# Altium schematic symbol library jlcpcb_2025_04_resistors_extended_2512.schlib: 2667 symbols (part 13 of 14) (continued)
## SMF25M2FR004T
designator R?  Resistance: 4mΩ  (hidden comment: *)
Resistor, 4mΩ, ±5%, 2W, ±100ppm/℃, -55℃~+170℃, SMD 2512; Manufacturer: Uniroyal; Manufacturer Part Number: SMF25M2FR004T; Supplier 1: LCSC; Supplier Part Number 1: C2692058; JLCPCB Part Number: C2692058; Power Rating: 2W; Category: Resistors; Package Size: 2512; JLCPCB Basic Part: Yes; Tolerance: ±5%; Temperature Coefficient: ±100ppm/℃; Temperature Rating: -55℃~+170℃; ComponentLink1Description: Datasheet; ComponentLink1URL: https://wmsc.lcsc.com/wmsc/upload/file/pdf/v2/lcsc/2201121130_SART-Nanjing-Sart-Tech-SMF25M2FR004T_C2692058.pdf; ComponentLink2Description: JLCPCB Part URL; ComponentLink2URL: https://jlcpcb.com/partdetail/C2692058
pins: 1, 2
1 alternate drawing of the same symbol

## SR2512FK-7W10RL
designator R?  Resistance: 10Ω  (hidden comment: *)
Resistor, 10Ω, ±1%, 2W, ±200ppm/℃, -55℃~+155℃, SMD 2512; Manufacturer: Uniroyal; Manufacturer Part Number: SR2512FK-7W10RL; Supplier 1: LCSC; Supplier Part Number 1: C876843; JLCPCB Part Number: C876843; Power Rating: 2W; Category: Resistors; Package Size: 2512; JLCPCB Basic Part: Yes; Tolerance: ±1%; Temperature Coefficient: ±200ppm/℃; Temperature Rating: -55℃~+155℃; ComponentLink1Description: Datasheet; ComponentLink1URL: https://wmsc.lcsc.com/wmsc/upload/file/pdf/v2/lcsc/2311211102_YAGEO-SR2512FK-7W10RL_C876843.pdf; ComponentLink2Description: JLCPCB Part URL; ComponentLink2URL: https://jlcpcb.com/partdetail/C876843
pins: 1, 2
1 alternate drawing of the same symbol

## SR2512FK-7W22RL
designator R?  Resistance: 22Ω  (hidden comment: *)
Resistor, 22Ω, ±1%, 2W, ±200ppm/℃, -55℃~+155℃, SMD 2512; Manufacturer: Uniroyal; Manufacturer Part Number: SR2512FK-7W22RL; Supplier 1: LCSC; Supplier Part Number 1: C876849; JLCPCB Part Number: C876849; Power Rating: 2W; Category: Resistors; Package Size: 2512; JLCPCB Basic Part: Yes; Tolerance: ±1%; Temperature Coefficient: ±200ppm/℃; Temperature Rating: -55℃~+155℃; ComponentLink1Description: Datasheet; ComponentLink1URL: https://wmsc.lcsc.com/wmsc/upload/file/pdf/v2/lcsc/2404241604_YAGEO-SR2512FK-7W22RL_C876849.pdf; ComponentLink2Description: JLCPCB Part URL; ComponentLink2URL: https://jlcpcb.com/partdetail/C876849
pins: 1, 2
1 alternate drawing of the same symbol

## SR2512FK-072R2L
designator R?  Resistance: 2.2Ω  (hidden comment: *)
Resistor, 2.2Ω, ±1%, 1W, 200V, ±200ppm/℃, -55℃~+155℃, SMD 2512; Manufacturer: Uniroyal; Manufacturer Part Number: SR2512FK-072R2L; Supplier 1: LCSC; Supplier Part Number 1: C2936638; JLCPCB Part Number: C2936638; Power Rating: 1W; Category: Resistors; Package Size: 2512; JLCPCB Basic Part: Yes; Tolerance: ±1%; Voltage Rating: 200V; Temperature Coefficient: ±200ppm/℃; Temperature Rating: -55℃~+155℃; ComponentLink1Description: Datasheet; ComponentLink1URL: https://wmsc.lcsc.com/wmsc/upload/file/pdf/v2/lcsc/2201121730_YAGEO-SR2512FK-072R2L_C2936638.pdf; ComponentLink2Description: JLCPCB Part URL; ComponentLink2URL: https://jlcpcb.com/partdetail/C2936638
pins: 1, 2
1 alternate drawing of the same symbol

## SR2512FK-0747RL
designator R?  Resistance: 47Ω  (hidden comment: *)
Resistor, 47Ω, ±1%, 1W, ±100ppm/℃, -55℃~+155℃, SMD 2512; Manufacturer: Uniroyal; Manufacturer Part Number: SR2512FK-0747RL; Supplier 1: LCSC; Supplier Part Number 1: C3014194; JLCPCB Part Number: C3014194; Power Rating: 1W; Category: Resistors; Package Size: 2512; JLCPCB Basic Part: Yes; Tolerance: ±1%; Temperature Coefficient: ±100ppm/℃; Temperature Rating: -55℃~+155℃; ComponentLink1Description: Datasheet; ComponentLink1URL: https://wmsc.lcsc.com/wmsc/upload/file/pdf/v2/lcsc/2205121145_YAGEO-SR2512FK-0747RL_C3014194.pdf; ComponentLink2Description: JLCPCB Part URL; ComponentLink2URL: https://jlcpcb.com/partdetail/C3014194
pins: 1, 2
1 alternate drawing of the same symbol

## SR2512FK-0751RL
designator R?  Resistance: 51Ω  (hidden comment: *)
Resistor, 51Ω, ±1%, 1W, 200V, ±100ppm/℃, -55℃~+155℃, SMD 2512; Manufacturer: Uniroyal; Manufacturer Part Number: SR2512FK-0751RL; Supplier 1: LCSC; Supplier Part Number 1: C375694; JLCPCB Part Number: C375694; Power Rating: 1W; Category: Resistors; Package Size: 2512; JLCPCB Basic Part: Yes; Tolerance: ±1%; Voltage Rating: 200V; Temperature Coefficient: ±100ppm/℃; Temperature Rating: -55℃~+155℃; ComponentLink1Description: Datasheet; ComponentLink1URL: https://wmsc.lcsc.com/wmsc/upload/file/pdf/v2/lcsc/1912111437_YAGEO-SR2512FK-0751RL_C375694.pdf; ComponentLink2Description: JLCPCB Part URL; ComponentLink2URL: https://jlcpcb.com/partdetail/C375694
pins: 1, 2
1 alternate drawing of the same symbol

## SR2512JK-071K2L
designator R?  Resistance: 1.2kΩ  (hidden comment: *)
Resistor, 1.2kΩ, ±5%, 1W, 200V, ±100ppm/℃, -55℃~+155℃, SMD 2512; Manufacturer: Uniroyal; Manufacturer Part Number: SR2512JK-071K2L; Supplier 1: LCSC; Supplier Part Number 1: C723719; JLCPCB Part Number: C723719; Power Rating: 1W; Category: Resistors; Package Size: 2512; JLCPCB Basic Part: Yes; Tolerance: ±5%; Voltage Rating: 200V; Temperature Coefficient: ±100ppm/℃; Temperature Rating: -55℃~+155℃; ComponentLink1Description: Datasheet; ComponentLink1URL: https://wmsc.lcsc.com/wmsc/upload/file/pdf/v2/lcsc/2304140030_YAGEO-SR2512JK-071K2L_C723719.pdf; ComponentLink2Description: JLCPCB Part URL; ComponentLink2URL: https://jlcpcb.com/partdetail/C723719
pins: 1, 2
1 alternate drawing of the same symbol

## SR2512JK-071R5L
designator R?  Resistance: 1.5Ω  (hidden comment: *)
Resistor, 1.5Ω, ±5%, 1W, 200V, ±200ppm/℃, -55℃~+155℃, SMD 2512; Manufacturer: Uniroyal; Manufacturer Part Number: SR2512JK-071R5L; Supplier 1: LCSC; Supplier Part Number 1: C876869; JLCPCB Part Number: C876869; Power Rating: 1W; Category: Resistors; Package Size: 2512; JLCPCB Basic Part: Yes; Tolerance: ±5%; Voltage Rating: 200V; Temperature Coefficient: ±200ppm/℃; Temperature Rating: -55℃~+155℃; ComponentLink1Description: Datasheet; ComponentLink1URL: https://wmsc.lcsc.com/wmsc/upload/file/pdf/v2/lcsc/2112131830_YAGEO-SR2512JK-071R5L_C876869.pdf; ComponentLink2Description: JLCPCB Part URL; ComponentLink2URL: https://jlcpcb.com/partdetail/C876869
pins: 1, 2
1 alternate drawing of the same symbol

## SR2512JK-072R7L
designator R?  Resistance: 2.7Ω  (hidden comment: *)
Resistor, 2.7Ω, ±5%, 1W, 200V, ±200ppm/℃, -55℃~+155℃, SMD 2512; Manufacturer: Uniroyal; Manufacturer Part Number: SR2512JK-072R7L; Supplier 1: LCSC; Supplier Part Number 1: C2936614; JLCPCB Part Number: C2936614; Power Rating: 1W; Category: Resistors; Package Size: 2512; JLCPCB Basic Part: Yes; Tolerance: ±5%; Voltage Rating: 200V; Temperature Coefficient: ±200ppm/℃; Temperature Rating: -55℃~+155℃; ComponentLink1Description: Datasheet; ComponentLink1URL: https://wmsc.lcsc.com/wmsc/upload/file/pdf/v2/lcsc/2201121730_YAGEO-SR2512JK-072R7L_C2936614.pdf; ComponentLink2Description: JLCPCB Part URL; ComponentLink2URL: https://jlcpcb.com/partdetail/C2936614
pins: 1, 2
1 alternate drawing of the same symbol

## SR2512JK-074R7L
designator R?  Resistance: 4.7Ω  (hidden comment: *)
Resistor, 4.7Ω, ±5%, 1W, 200V, ±200ppm/℃, -55℃~+155℃, SMD 2512; Manufacturer: Uniroyal; Manufacturer Part Number: SR2512JK-074R7L; Supplier 1: LCSC; Supplier Part Number 1: C876895; JLCPCB Part Number: C876895; Power Rating: 1W; Category: Resistors; Package Size: 2512; JLCPCB Basic Part: Yes; Tolerance: ±5%; Voltage Rating: 200V; Temperature Coefficient: ±200ppm/℃; Temperature Rating: -55℃~+155℃; ComponentLink1Description: Datasheet; ComponentLink1URL: https://wmsc.lcsc.com/wmsc/upload/file/pdf/v2/lcsc/2112131830_YAGEO-SR2512JK-074R7L_C876895.pdf; ComponentLink2Description: JLCPCB Part URL; ComponentLink2URL: https://jlcpcb.com/partdetail/C876895
pins: 1, 2
1 alternate drawing of the same symbol

## SR2512JK-075R1L
designator R?  Resistance: 5.1Ω  (hidden comment: *)
Resistor, 5.1Ω, ±5%, 1W, 200V, ±200ppm/℃, -55℃~+155℃, SMD 2512; Manufacturer: Uniroyal; Manufacturer Part Number: SR2512JK-075R1L; Supplier 1: LCSC; Supplier Part Number 1: C876898; JLCPCB Part Number: C876898; Power Rating: 1W; Category: Resistors; Package Size: 2512; JLCPCB Basic Part: Yes; Tolerance: ±5%; Voltage Rating: 200V; Temperature Coefficient: ±200ppm/℃; Temperature Rating: -55℃~+155℃; ComponentLink1Description: Datasheet; ComponentLink1URL: https://wmsc.lcsc.com/wmsc/upload/file/pdf/v2/lcsc/2112131830_YAGEO-SR2512JK-075R1L_C876898.pdf; ComponentLink2Description: JLCPCB Part URL; ComponentLink2URL: https://jlcpcb.com/partdetail/C876898
pins: 1, 2
1 alternate drawing of the same symbol

## SR2512JK-076R8L
designator R?  Resistance: 6.8Ω  (hidden comment: *)
Resistor, 6.8Ω, ±5%, 1W, 200V, ±200ppm/℃, -55℃~+155℃, SMD 2512; Manufacturer: Uniroyal; Manufacturer Part Number: SR2512JK-076R8L; Supplier 1: LCSC; Supplier Part Number 1: C2936600; JLCPCB Part Number: C2936600; Power Rating: 1W; Category: Resistors; Package Size: 2512; JLCPCB Basic Part: Yes; Tolerance: ±5%; Voltage Rating: 200V; Temperature Coefficient: ±200ppm/℃; Temperature Rating: -55℃~+155℃; ComponentLink1Description: Datasheet; ComponentLink1URL: https://wmsc.lcsc.com/wmsc/upload/file/pdf/v2/lcsc/2201121730_YAGEO-SR2512JK-076R8L_C2936600.pdf; ComponentLink2Description: JLCPCB Part URL; ComponentLink2URL: https://jlcpcb.com/partdetail/C2936600
pins: 1, 2
1 alternate drawing of the same symbol

## SR2512JK-0720RL
designator R?  Resistance: 20Ω  (hidden comment: *)
Resistor, 20Ω, ±5%, 1W, 200V, ±100ppm/℃, -55℃~+155℃, SMD 2512; Manufacturer: Uniroyal; Manufacturer Part Number: SR2512JK-0720RL; Supplier 1: LCSC; Supplier Part Number 1: C723493; JLCPCB Part Number: C723493; Power Rating: 1W; Category: Resistors; Package Size: 2512; JLCPCB Basic Part: Yes; Tolerance: ±5%; Voltage Rating: 200V; Temperature Coefficient: ±100ppm/℃; Temperature Rating: -55℃~+155℃; ComponentLink1Description: Datasheet; ComponentLink1URL: https://wmsc.lcsc.com/wmsc/upload/file/pdf/v2/lcsc/2304140030_YAGEO-SR2512JK-0720RL_C723493.pdf; ComponentLink2Description: JLCPCB Part URL; ComponentLink2URL: https://jlcpcb.com/partdetail/C723493
pins: 1, 2
1 alternate drawing of the same symbol

## SR2512KK-076R8L
designator R?  Resistance: 6.8Ω  (hidden comment: *)
Resistor, 6.8Ω, ±10%, 1W, ±200ppm/℃, -55℃~+155℃, SMD 2512; Manufacturer: Uniroyal; Manufacturer Part Number: SR2512KK-076R8L; Supplier 1: LCSC; Supplier Part Number 1: C3014190; JLCPCB Part Number: C3014190; Power Rating: 1W; Category: Resistors; Package Size: 2512; JLCPCB Basic Part: Yes; Tolerance: ±10%; Temperature Coefficient: ±200ppm/℃; Temperature Rating: -55℃~+155℃; ComponentLink1Description: Datasheet; ComponentLink1URL: https://wmsc.lcsc.com/wmsc/upload/file/pdf/v2/lcsc/2205121145_YAGEO-SR2512KK-076R8L_C3014190.pdf; ComponentLink2Description: JLCPCB Part URL; ComponentLink2URL: https://jlcpcb.com/partdetail/C3014190
pins: 1, 2
1 alternate drawing of the same symbol

## SWR12JTEA0470
designator R?  Resistance: 47Ω  (hidden comment: *)
Resistor, 47Ω, ±5%, 1.5W, 500V, ±100ppm/℃, -55℃~+155℃, SMD 2512; Manufacturer: Uniroyal; Manufacturer Part Number: SWR12JTEA0470; Supplier 1: LCSC; Supplier Part Number 1: C2913007; JLCPCB Part Number: C2913007; Power Rating: 1.5W; Category: Resistors; Package Size: 2512; JLCPCB Basic Part: Yes; Tolerance: ±5%; Voltage Rating: 500V; Temperature Coefficient: ±100ppm/℃; Temperature Rating: -55℃~+155℃; ComponentLink1Description: Datasheet; ComponentLink1URL: https://wmsc.lcsc.com/wmsc/upload/file/pdf/v2/lcsc/2110281830_Viking-Tech-SWR12JTEA0470_C2913007.pdf; ComponentLink2Description: JLCPCB Part URL; ComponentLink2URL: https://jlcpcb.com/partdetail/C2913007
pins: 1, 2
1 alternate drawing of the same symbol

## TC1250B2801T4P
designator R?  Resistance: 2.8kΩ  (hidden comment: *)
Resistor, 2.8kΩ, ±0.1%, 500mW, ±50ppm/℃, SMD 2512; Manufacturer: Uniroyal; Manufacturer Part Number: TC1250B2801T4P; Supplier 1: LCSC; Supplier Part Number 1: C517745; JLCPCB Part Number: C517745; Power Rating: 500mW; Category: Resistors; Package Size: 2512; JLCPCB Basic Part: Yes; Tolerance: ±0.1%; Temperature Coefficient: ±50ppm/℃; ComponentLink1Description: Datasheet; ComponentLink1URL: https://wmsc.lcsc.com/wmsc/upload/file/pdf/v2/lcsc/2304140030_UNI-ROYAL-Uniroyal-Elec-TC1250B2801T4P_C517745.pdf; ComponentLink2Description: JLCPCB Part URL; ComponentLink2URL: https://jlcpcb.com/partdetail/C517745
pins: 1, 2
1 alternate drawing of the same symbol

## TGL251220FR150E04Z
designator R?  Resistance: 150mΩ  (hidden comment: *)
Resistor, 150mΩ, ±1%, 2W, ±50ppm/℃, -55℃~+170℃, SMD 2512; Manufacturer: Uniroyal; Manufacturer Part Number: TGL251220FR150E04Z; Supplier 1: LCSC; Supplier Part Number 1: C881082; JLCPCB Part Number: C881082; Power Rating: 2W; Category: Resistors; Package Size: 2512; JLCPCB Basic Part: Yes; Tolerance: ±1%; Temperature Coefficient: ±50ppm/℃; Temperature Rating: -55℃~+170℃; ComponentLink1Description: Datasheet; ComponentLink1URL: https://wmsc.lcsc.com/wmsc/upload/file/pdf/v2/lcsc/2304140030_Ever-Ohms-Tech-TGL251220FR150E04Z_C881082.pdf; ComponentLink2Description: JLCPCB Part URL; ComponentLink2URL: https://jlcpcb.com/partdetail/C881082
pins: 1, 2
1 alternate drawing of the same symbol

## TGL251220FR500E04Z
designator R?  Resistance: 500mΩ  (hidden comment: *)
Resistor, 500mΩ, ±1%, 2W, ±50ppm/℃, -55℃~+170℃, SMD 2512; Manufacturer: Uniroyal; Manufacturer Part Number: TGL251220FR500E04Z; Supplier 1: LCSC; Supplier Part Number 1: C881206; JLCPCB Part Number: C881206; Power Rating: 2W; Category: Resistors; Package Size: 2512; JLCPCB Basic Part: Yes; Tolerance: ±1%; Temperature Coefficient: ±50ppm/℃; Temperature Rating: -55℃~+170℃; ComponentLink1Description: Datasheet; ComponentLink1URL: https://wmsc.lcsc.com/wmsc/upload/file/pdf/v2/lcsc/2304140030_Ever-Ohms-Tech-TGL251220FR500E04Z_C881206.pdf; ComponentLink2Description: JLCPCB Part URL; ComponentLink2URL: https://jlcpcb.com/partdetail/C881206
pins: 1, 2
1 alternate drawing of the same symbol

## TJ12G4992BT
designator R?  Resistance: 49.9kΩ  (hidden comment: *)
Resistor, 49.9kΩ, ±0.1%, 1W, ±25ppm/℃, -55℃~+155℃, SMD 2512; Manufacturer: Uniroyal; Manufacturer Part Number: TJ12G4992BT; Supplier 1: LCSC; Supplier Part Number 1: C2961443; JLCPCB Part Number: C2961443; Power Rating: 1W; Category: Resistors; Package Size: 2512; JLCPCB Basic Part: Yes; Tolerance: ±0.1%; Temperature Coefficient: ±25ppm/℃; Temperature Rating: -55℃~+155℃; ComponentLink1Description: Datasheet; ComponentLink1URL: https://wmsc.lcsc.com/wmsc/upload/file/pdf/v2/lcsc/2201241630_FH--Guangdong-Fenghua-Advanced-Tech-TJ12G4992BT_C2961443.pdf; ComponentLink2Description: JLCPCB Part URL; ComponentLink2URL: https://jlcpcb.com/partdetail/C2961443
pins: 1, 2
1 alternate drawing of the same symbol

## TLR3APDTE10L0F75
designator R?  Resistance: 10mΩ  (hidden comment: *)
Resistor, 10mΩ, ±1%, 3W, ±75ppm/℃, -65℃~+170℃, SMD 2512; Manufacturer: Uniroyal; Manufacturer Part Number: TLR3APDTE10L0F75; Supplier 1: LCSC; Supplier Part Number 1: C782250; JLCPCB Part Number: C782250; Power Rating: 3W; Category: Resistors; Package Size: 2512; JLCPCB Basic Part: Yes; Tolerance: ±1%; Temperature Coefficient: ±75ppm/℃; Temperature Rating: -65℃~+170℃; ComponentLink1Description: Datasheet; ComponentLink1URL: https://wmsc.lcsc.com/wmsc/upload/file/pdf/v2/lcsc/2009101103_KOA-Speer-Elec-TLR3APDTE10L0F75_C782250.pdf; ComponentLink2Description: JLCPCB Part URL; ComponentLink2URL: https://jlcpcb.com/partdetail/C782250
pins: 1, 2
1 alternate drawing of the same symbol

## TLR3APDTEL820F75
designator R?  Resistance: 0.82mΩ  (hidden comment: *)
Resistor, 0.82mΩ, ±1%, 5W, ±75ppm/℃, -65℃~+170℃, SMD 2512; Manufacturer: Uniroyal; Manufacturer Part Number: TLR3APDTEL820F75; Supplier 1: LCSC; Supplier Part Number 1: C4121274; JLCPCB Part Number: C4121274; Power Rating: 5W; Category: Resistors; Package Size: 2512; JLCPCB Basic Part: Yes; Tolerance: ±1%; Temperature Coefficient: ±75ppm/℃; Temperature Rating: -65℃~+170℃; ComponentLink1Description: Datasheet; ComponentLink1URL: https://wmsc.lcsc.com/wmsc/upload/file/pdf/v2/lcsc/2404101036_KOA-Speer-Elec-TLR3APDTEL820F75_C4121274.pdf; ComponentLink2Description: JLCPCB Part URL; ComponentLink2URL: https://jlcpcb.com/partdetail/C4121274
pins: 1, 2
1 alternate drawing of the same symbol

## TLR3AWDTE5L00F
designator R?  Resistance: 5mΩ  (hidden comment: *)
Resistor, 5mΩ, ±1%, 2W, ±150ppm/℃, -65℃~+170℃, SMD 2512; Manufacturer: Uniroyal; Manufacturer Part Number: TLR3AWDTE5L00F; Supplier 1: LCSC; Supplier Part Number 1: C782251; JLCPCB Part Number: C782251; Power Rating: 2W; Category: Resistors; Package Size: 2512; JLCPCB Basic Part: Yes; Tolerance: ±1%; Temperature Coefficient: ±150ppm/℃; Temperature Rating: -65℃~+170℃; ComponentLink1Description: Datasheet; ComponentLink1URL: https://wmsc.lcsc.com/wmsc/upload/file/pdf/v2/lcsc/2009101908_KOA-Speer-Elec-TLR3AWDTE5L00F_C782251.pdf; ComponentLink2Description: JLCPCB Part URL; ComponentLink2URL: https://jlcpcb.com/partdetail/C782251
pins: 1, 2
1 alternate drawing of the same symbol

## TLR3AWDTE6L00F
designator R?  Resistance: 6mΩ  (hidden comment: *)
Resistor, 6mΩ, ±1%, 2W, ±150ppm/℃, -65℃~+170℃, SMD 2512; Manufacturer: Uniroyal; Manufacturer Part Number: TLR3AWDTE6L00F; Supplier 1: LCSC; Supplier Part Number 1: C782252; JLCPCB Part Number: C782252; Power Rating: 2W; Category: Resistors; Package Size: 2512; JLCPCB Basic Part: Yes; Tolerance: ±1%; Temperature Coefficient: ±150ppm/℃; Temperature Rating: -65℃~+170℃; ComponentLink1Description: Datasheet; ComponentLink1URL: https://wmsc.lcsc.com/wmsc/upload/file/pdf/v2/lcsc/2009101908_KOA-Speer-Elec-TLR3AWDTE6L00F_C782252.pdf; ComponentLink2Description: JLCPCB Part URL; ComponentLink2URL: https://jlcpcb.com/partdetail/C782252
pins: 1, 2
1 alternate drawing of the same symbol

## TLRP3A30CR033FTE
designator R?  Resistance: 33mΩ  (hidden comment: *)
Resistor, 33mΩ, ±1%, 3W, ±25ppm/℃, -55℃~+170℃, SMD 2512; Manufacturer: Uniroyal; Manufacturer Part Number: TLRP3A30CR033FTE; Supplier 1: LCSC; Supplier Part Number 1: C4277659; JLCPCB Part Number: C4277659; Power Rating: 3W; Category: Resistors; Package Size: 2512; JLCPCB Basic Part: Yes; Tolerance: ±1%; Temperature Coefficient: ±25ppm/℃; Temperature Rating: -55℃~+170℃; ComponentLink1Description: Datasheet; ComponentLink1URL: https://wmsc.lcsc.com/wmsc/upload/file/pdf/v2/lcsc/2404111717_TE-Connectivity-TLRP3A30CR033FTE_C4277659.pdf; ComponentLink2Description: JLCPCB Part URL; ComponentLink2URL: https://jlcpcb.com/partdetail/C4277659
pins: 1, 2
1 alternate drawing of the same symbol

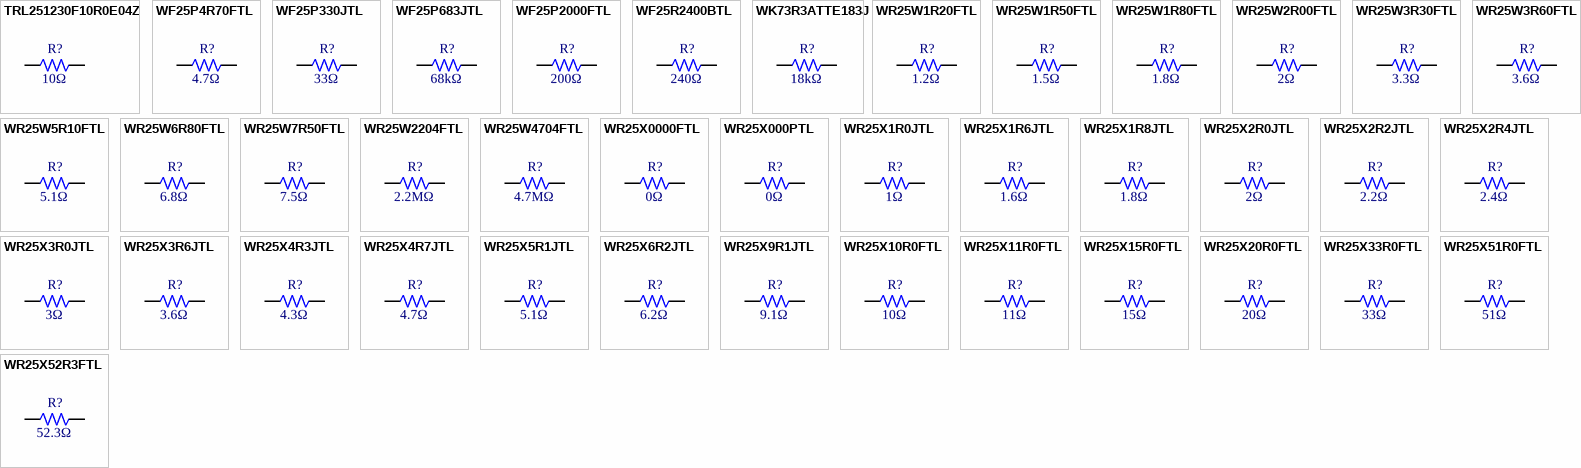
[diagram p62: symbols TRL251230F10R0E04Z to WR25X52R3FTL]

## TRL251230F10R0E04Z
designator R?  Resistance: 10Ω  (hidden comment: *)
Resistor, 10Ω, ±1%, 3W, ±50ppm/℃, -55℃~+155℃, SMD 2512; Manufacturer: Uniroyal; Manufacturer Part Number: TRL251230F10R0E04Z; Supplier 1: LCSC; Supplier Part Number 1: C2992634; JLCPCB Part Number: C2992634; Power Rating: 3W; Category: Resistors; Package Size: 2512; JLCPCB Basic Part: Yes; Tolerance: ±1%; Temperature Coefficient: ±50ppm/℃; Temperature Rating: -55℃~+155℃; ComponentLink1Description: Datasheet; ComponentLink1URL: https://wmsc.lcsc.com/wmsc/upload/file/pdf/v2/lcsc/2204082230_Ever-Ohms-Tech-TRL251230F10R0E04Z_C2992634.pdf; ComponentLink2Description: JLCPCB Part URL; ComponentLink2URL: https://jlcpcb.com/partdetail/C2992634
pins: 1, 2
1 alternate drawing of the same symbol

## WF25P4R70FTL
designator R?  Resistance: 4.7Ω  (hidden comment: *)
Resistor, 4.7Ω, ±1%, 2W, 300V, ±100ppm/℃, -55℃~+155℃, SMD 2512; Manufacturer: Uniroyal; Manufacturer Part Number: WF25P4R70FTL; Supplier 1: LCSC; Supplier Part Number 1: C305271; JLCPCB Part Number: C305271; Power Rating: 2W; Category: Resistors; Package Size: 2512; JLCPCB Basic Part: Yes; Tolerance: ±1%; Voltage Rating: 300V; Temperature Coefficient: ±100ppm/℃; Temperature Rating: -55℃~+155℃; ComponentLink1Description: Datasheet; ComponentLink1URL: https://wmsc.lcsc.com/wmsc/upload/file/pdf/v2/lcsc/2304140030_Walsin-Tech-Corp-WF25P4R70FTL_C305271.pdf; ComponentLink2Description: JLCPCB Part URL; ComponentLink2URL: https://jlcpcb.com/partdetail/C305271
pins: 1, 2
1 alternate drawing of the same symbol

## WF25P330JTL
designator R?  Resistance: 33Ω  (hidden comment: *)
Resistor, 33Ω, ±5%, 1W, 200V, ±100ppm/℃, -55℃~+155℃, SMD 2512; Manufacturer: Uniroyal; Manufacturer Part Number: WF25P330JTL; Supplier 1: LCSC; Supplier Part Number 1: C2974579; JLCPCB Part Number: C2974579; Power Rating: 1W; Category: Resistors; Package Size: 2512; JLCPCB Basic Part: Yes; Tolerance: ±5%; Voltage Rating: 200V; Temperature Coefficient: ±100ppm/℃; Temperature Rating: -55℃~+155℃; ComponentLink1Description: Datasheet; ComponentLink1URL: https://wmsc.lcsc.com/wmsc/upload/file/pdf/v2/lcsc/2202111500_Walsin-Tech-Corp-WF25P330JTL_C2974579.pdf; ComponentLink2Description: JLCPCB Part URL; ComponentLink2URL: https://jlcpcb.com/partdetail/C2974579
pins: 1, 2
1 alternate drawing of the same symbol

## WF25P683JTL
designator R?  Resistance: 68kΩ  (hidden comment: *)
Resistor, 68kΩ, ±5%, 2W, 200V, ±100ppm/℃, -55℃~+155℃, SMD 2512; Manufacturer: Uniroyal; Manufacturer Part Number: WF25P683JTL; Supplier 1: LCSC; Supplier Part Number 1: C2974581; JLCPCB Part Number: C2974581; Power Rating: 2W; Category: Resistors; Package Size: 2512; JLCPCB Basic Part: Yes; Tolerance: ±5%; Voltage Rating: 200V; Temperature Coefficient: ±100ppm/℃; Temperature Rating: -55℃~+155℃; ComponentLink1Description: Datasheet; ComponentLink1URL: https://wmsc.lcsc.com/wmsc/upload/file/pdf/v2/lcsc/2202111500_Walsin-Tech-Corp-WF25P683JTL_C2974581.pdf; ComponentLink2Description: JLCPCB Part URL; ComponentLink2URL: https://jlcpcb.com/partdetail/C2974581
pins: 1, 2
1 alternate drawing of the same symbol

## WF25P2000FTL
designator R?  Resistance: 200Ω  (hidden comment: *)
Resistor, 200Ω, ±1%, 2W, 300V, ±100ppm/℃, -55℃~+155℃, SMD 2512; Manufacturer: Uniroyal; Manufacturer Part Number: WF25P2000FTL; Supplier 1: LCSC; Supplier Part Number 1: C2991396; JLCPCB Part Number: C2991396; Power Rating: 2W; Category: Resistors; Package Size: 2512; JLCPCB Basic Part: Yes; Tolerance: ±1%; Voltage Rating: 300V; Temperature Coefficient: ±100ppm/℃; Temperature Rating: -55℃~+155℃; ComponentLink1Description: Datasheet; ComponentLink1URL: https://wmsc.lcsc.com/wmsc/upload/file/pdf/v2/lcsc/2204081930_Walsin-Tech-Corp-WF25P2000FTL_C2991396.pdf; ComponentLink2Description: JLCPCB Part URL; ComponentLink2URL: https://jlcpcb.com/partdetail/C2991396
pins: 1, 2
1 alternate drawing of the same symbol

## WF25R2400BTL
designator R?  Resistance: 240Ω  (hidden comment: *)
Resistor, 240Ω, ±0.1%, 1W, 200V, ±25ppm/℃, -55℃~+155℃, SMD 2512; Manufacturer: Uniroyal; Manufacturer Part Number: WF25R2400BTL; Supplier 1: LCSC; Supplier Part Number 1: C305272; JLCPCB Part Number: C305272; Power Rating: 1W; Category: Resistors; Package Size: 2512; JLCPCB Basic Part: Yes; Tolerance: ±0.1%; Voltage Rating: 200V; Temperature Coefficient: ±25ppm/℃; Temperature Rating: -55℃~+155℃; ComponentLink1Description: Datasheet; ComponentLink1URL: https://wmsc.lcsc.com/wmsc/upload/file/pdf/v2/lcsc/1811141211_Walsin-Tech-Corp-WF25R2400BTL_C305272.pdf; ComponentLink2Description: JLCPCB Part URL; ComponentLink2URL: https://jlcpcb.com/partdetail/C305272
pins: 1, 2
1 alternate drawing of the same symbol

## WK73R3ATTE183J
designator R?  Resistance: 18kΩ  (hidden comment: *)
Resistor, 18kΩ, ±5%, 1.5W, 200V, ±100ppm/℃, -55℃~+155℃, SMD 2512; Manufacturer: Uniroyal; Manufacturer Part Number: WK73R3ATTE183J; Supplier 1: LCSC; Supplier Part Number 1: C515006; JLCPCB Part Number: C515006; Power Rating: 1.5W; Category: Resistors; Package Size: 2512; JLCPCB Basic Part: Yes; Tolerance: ±5%; Voltage Rating: 200V; Temperature Coefficient: ±100ppm/℃; Temperature Rating: -55℃~+155℃; ComponentLink1Description: Datasheet; ComponentLink1URL: https://wmsc.lcsc.com/wmsc/upload/file/pdf/v2/lcsc/2005150703_KOA-Speer-Elec-WK73R3ATTE183J_C515006.pdf; ComponentLink2Description: JLCPCB Part URL; ComponentLink2URL: https://jlcpcb.com/partdetail/C515006
pins: 1, 2
1 alternate drawing of the same symbol

## WR25W1R20FTL
designator R?  Resistance: 1.2Ω  (hidden comment: *)
Resistor, 1.2Ω, ±1%, 1W, 250V, ±200ppm/℃, -55℃~+155℃, SMD 2512; Manufacturer: Uniroyal; Manufacturer Part Number: WR25W1R20FTL; Supplier 1: LCSC; Supplier Part Number 1: C171296; JLCPCB Part Number: C171296; Power Rating: 1W; Category: Resistors; Package Size: 2512; JLCPCB Basic Part: Yes; Tolerance: ±1%; Voltage Rating: 250V; Temperature Coefficient: ±200ppm/℃; Temperature Rating: -55℃~+155℃; ComponentLink1Description: Datasheet; ComponentLink1URL: https://wmsc.lcsc.com/wmsc/upload/file/pdf/v2/lcsc/2304140030_Walsin-Tech-Corp-WR25W1R20FTL_C171296.pdf; ComponentLink2Description: JLCPCB Part URL; ComponentLink2URL: https://jlcpcb.com/partdetail/C171296
pins: 1, 2
1 alternate drawing of the same symbol

## WR25W1R50FTL
designator R?  Resistance: 1.5Ω  (hidden comment: *)
Resistor, 1.5Ω, ±1%, 1W, 250V, ±200ppm/℃, -55℃~+155℃, SMD 2512; Manufacturer: Uniroyal; Manufacturer Part Number: WR25W1R50FTL; Supplier 1: LCSC; Supplier Part Number 1: C171297; JLCPCB Part Number: C171297; Power Rating: 1W; Category: Resistors; Package Size: 2512; JLCPCB Basic Part: Yes; Tolerance: ±1%; Voltage Rating: 250V; Temperature Coefficient: ±200ppm/℃; Temperature Rating: -55℃~+155℃; ComponentLink1Description: Datasheet; ComponentLink1URL: https://wmsc.lcsc.com/wmsc/upload/file/pdf/v2/lcsc/2304140030_Walsin-Tech-Corp-WR25W1R50FTL_C171297.pdf; ComponentLink2Description: JLCPCB Part URL; ComponentLink2URL: https://jlcpcb.com/partdetail/C171297
pins: 1, 2
1 alternate drawing of the same symbol

## WR25W1R80FTL
designator R?  Resistance: 1.8Ω  (hidden comment: *)
Resistor, 1.8Ω, ±1%, 1W, 250V, ±200ppm/℃, -55℃~+155℃, SMD 2512; Manufacturer: Uniroyal; Manufacturer Part Number: WR25W1R80FTL; Supplier 1: LCSC; Supplier Part Number 1: C383920; JLCPCB Part Number: C383920; Power Rating: 1W; Category: Resistors; Package Size: 2512; JLCPCB Basic Part: Yes; Tolerance: ±1%; Voltage Rating: 250V; Temperature Coefficient: ±200ppm/℃; Temperature Rating: -55℃~+155℃; ComponentLink1Description: Datasheet; ComponentLink1URL: https://wmsc.lcsc.com/wmsc/upload/file/pdf/v2/lcsc/2304140030_Walsin-Tech-Corp-WR25W1R80FTL_C383920.pdf; ComponentLink2Description: JLCPCB Part URL; ComponentLink2URL: https://jlcpcb.com/partdetail/C383920
pins: 1, 2
1 alternate drawing of the same symbol

## WR25W2R00FTL
designator R?  Resistance: 2Ω  (hidden comment: *)
Resistor, 2Ω, ±1%, 1W, 250V, ±200ppm/℃, -55℃~+155℃, SMD 2512; Manufacturer: Uniroyal; Manufacturer Part Number: WR25W2R00FTL; Supplier 1: LCSC; Supplier Part Number 1: C171299; JLCPCB Part Number: C171299; Power Rating: 1W; Category: Resistors; Package Size: 2512; JLCPCB Basic Part: Yes; Tolerance: ±1%; Voltage Rating: 250V; Temperature Coefficient: ±200ppm/℃; Temperature Rating: -55℃~+155℃; ComponentLink1Description: Datasheet; ComponentLink1URL: https://wmsc.lcsc.com/wmsc/upload/file/pdf/v2/lcsc/2304140030_Walsin-Tech-Corp-WR25W2R00FTL_C171299.pdf; ComponentLink2Description: JLCPCB Part URL; ComponentLink2URL: https://jlcpcb.com/partdetail/C171299
pins: 1, 2
1 alternate drawing of the same symbol

## WR25W3R30FTL
designator R?  Resistance: 3.3Ω  (hidden comment: *)
Resistor, 3.3Ω, ±1%, 1W, 250V, ±200ppm/℃, -55℃~+155℃, SMD 2512; Manufacturer: Uniroyal; Manufacturer Part Number: WR25W3R30FTL; Supplier 1: LCSC; Supplier Part Number 1: C171303; JLCPCB Part Number: C171303; Power Rating: 1W; Category: Resistors; Package Size: 2512; JLCPCB Basic Part: Yes; Tolerance: ±1%; Voltage Rating: 250V; Temperature Coefficient: ±200ppm/℃; Temperature Rating: -55℃~+155℃; ComponentLink1Description: Datasheet; ComponentLink1URL: https://wmsc.lcsc.com/wmsc/upload/file/pdf/v2/lcsc/2304140030_Walsin-Tech-Corp-WR25W3R30FTL_C171303.pdf; ComponentLink2Description: JLCPCB Part URL; ComponentLink2URL: https://jlcpcb.com/partdetail/C171303
pins: 1, 2
1 alternate drawing of the same symbol

## WR25W3R60FTL
designator R?  Resistance: 3.6Ω  (hidden comment: *)
Resistor, 3.6Ω, ±1%, 1W, 250V, ±200ppm/℃, -55℃~+155℃, SMD 2512; Manufacturer: Uniroyal; Manufacturer Part Number: WR25W3R60FTL; Supplier 1: LCSC; Supplier Part Number 1: C171304; JLCPCB Part Number: C171304; Power Rating: 1W; Category: Resistors; Package Size: 2512; JLCPCB Basic Part: Yes; Tolerance: ±1%; Voltage Rating: 250V; Temperature Coefficient: ±200ppm/℃; Temperature Rating: -55℃~+155℃; ComponentLink1Description: Datasheet; ComponentLink1URL: https://wmsc.lcsc.com/wmsc/upload/file/pdf/v2/lcsc/2304140030_Walsin-Tech-Corp-WR25W3R60FTL_C171304.pdf; ComponentLink2Description: JLCPCB Part URL; ComponentLink2URL: https://jlcpcb.com/partdetail/C171304
pins: 1, 2
1 alternate drawing of the same symbol

## WR25W5R10FTL
designator R?  Resistance: 5.1Ω  (hidden comment: *)
Resistor, 5.1Ω, ±1%, 1W, -55℃~+155℃, SMD 2512; Manufacturer: Uniroyal; Manufacturer Part Number: WR25W5R10FTL; Supplier 1: LCSC; Supplier Part Number 1: C2991415; JLCPCB Part Number: C2991415; Power Rating: 1W; Category: Resistors; Package Size: 2512; JLCPCB Basic Part: Yes; Tolerance: ±1%; Temperature Rating: -55℃~+155℃; ComponentLink1Description: Datasheet; ComponentLink1URL: https://wmsc.lcsc.com/wmsc/upload/file/pdf/v2/lcsc/2204081930_Walsin-Tech-Corp-WR25W5R10FTL_C2991415.pdf; ComponentLink2Description: JLCPCB Part URL; ComponentLink2URL: https://jlcpcb.com/partdetail/C2991415
pins: 1, 2
1 alternate drawing of the same symbol

## WR25W6R80FTL
designator R?  Resistance: 6.8Ω  (hidden comment: *)
Resistor, 6.8Ω, ±1%, 1W, 250V, ±200ppm/℃, -55℃~+155℃, SMD 2512; Manufacturer: Uniroyal; Manufacturer Part Number: WR25W6R80FTL; Supplier 1: LCSC; Supplier Part Number 1: C171310; JLCPCB Part Number: C171310; Power Rating: 1W; Category: Resistors; Package Size: 2512; JLCPCB Basic Part: Yes; Tolerance: ±1%; Voltage Rating: 250V; Temperature Coefficient: ±200ppm/℃; Temperature Rating: -55℃~+155℃; ComponentLink1Description: Datasheet; ComponentLink1URL: https://wmsc.lcsc.com/wmsc/upload/file/pdf/v2/lcsc/2304140030_Walsin-Tech-Corp-WR25W6R80FTL_C171310.pdf; ComponentLink2Description: JLCPCB Part URL; ComponentLink2URL: https://jlcpcb.com/partdetail/C171310
pins: 1, 2
1 alternate drawing of the same symbol

## WR25W7R50FTL
designator R?  Resistance: 7.5Ω  (hidden comment: *)
Resistor, 7.5Ω, ±1%, 1W, 250V, ±200ppm/℃, -55℃~+155℃, SMD 2512; Manufacturer: Uniroyal; Manufacturer Part Number: WR25W7R50FTL; Supplier 1: LCSC; Supplier Part Number 1: C171311; JLCPCB Part Number: C171311; Power Rating: 1W; Category: Resistors; Package Size: 2512; JLCPCB Basic Part: Yes; Tolerance: ±1%; Voltage Rating: 250V; Temperature Coefficient: ±200ppm/℃; Temperature Rating: -55℃~+155℃; ComponentLink1Description: Datasheet; ComponentLink1URL: https://wmsc.lcsc.com/wmsc/upload/file/pdf/v2/lcsc/2304140030_Walsin-Tech-Corp-WR25W7R50FTL_C171311.pdf; ComponentLink2Description: JLCPCB Part URL; ComponentLink2URL: https://jlcpcb.com/partdetail/C171311
pins: 1, 2
1 alternate drawing of the same symbol

## WR25W2204FTL
designator R?  Resistance: 2.2MΩ  (hidden comment: *)
Resistor, 2.2MΩ, ±1%, 1W, 250V, ±100ppm/℃, -55℃~+155℃, SMD 2512; Manufacturer: Uniroyal; Manufacturer Part Number: WR25W2204FTL; Supplier 1: LCSC; Supplier Part Number 1: C172280; JLCPCB Part Number: C172280; Power Rating: 1W; Category: Resistors; Package Size: 2512; JLCPCB Basic Part: Yes; Tolerance: ±1%; Voltage Rating: 250V; Temperature Coefficient: ±100ppm/℃; Temperature Rating: -55℃~+155℃; ComponentLink1Description: Datasheet; ComponentLink1URL: https://wmsc.lcsc.com/wmsc/upload/file/pdf/v2/lcsc/2304140030_Walsin-Tech-Corp-WR25W2204FTL_C172280.pdf; ComponentLink2Description: JLCPCB Part URL; ComponentLink2URL: https://jlcpcb.com/partdetail/C172280
pins: 1, 2
1 alternate drawing of the same symbol

## WR25W4704FTL
designator R?  Resistance: 4.7MΩ  (hidden comment: *)
Resistor, 4.7MΩ, ±1%, 1W, 250V, ±100ppm/℃, -55℃~+155℃, SMD 2512; Manufacturer: Uniroyal; Manufacturer Part Number: WR25W4704FTL; Supplier 1: LCSC; Supplier Part Number 1: C172284; JLCPCB Part Number: C172284; Power Rating: 1W; Category: Resistors; Package Size: 2512; JLCPCB Basic Part: Yes; Tolerance: ±1%; Voltage Rating: 250V; Temperature Coefficient: ±100ppm/℃; Temperature Rating: -55℃~+155℃; ComponentLink1Description: Datasheet; ComponentLink1URL: https://wmsc.lcsc.com/wmsc/upload/file/pdf/v2/lcsc/2304140030_Walsin-Tech-Corp-WR25W4704FTL_C172284.pdf; ComponentLink2Description: JLCPCB Part URL; ComponentLink2URL: https://jlcpcb.com/partdetail/C172284
pins: 1, 2
1 alternate drawing of the same symbol

## WR25X0000FTL
designator R?  Resistance: 0Ω  (hidden comment: *)
Resistor, 0Ω, ±1%, 1W, 250V, ±200ppm/℃, -55℃~+155℃, SMD 2512; Manufacturer: Uniroyal; Manufacturer Part Number: WR25X0000FTL; Supplier 1: LCSC; Supplier Part Number 1: C335028; JLCPCB Part Number: C335028; Power Rating: 1W; Category: Resistors; Package Size: 2512; JLCPCB Basic Part: Yes; Tolerance: ±1%; Voltage Rating: 250V; Temperature Coefficient: ±200ppm/℃; Temperature Rating: -55℃~+155℃; ComponentLink1Description: Datasheet; ComponentLink1URL: https://wmsc.lcsc.com/wmsc/upload/file/pdf/v2/lcsc/2304140030_Walsin-Tech-Corp-WR25X0000FTL_C335028.pdf; ComponentLink2Description: JLCPCB Part URL; ComponentLink2URL: https://jlcpcb.com/partdetail/C335028
pins: 1, 2
1 alternate drawing of the same symbol

## WR25X000PTL
designator R?  Resistance: 0Ω  (hidden comment: *)
Resistor, 0Ω, 1W, 250V, ±200ppm/℃, -55℃~+155℃, SMD 2512; Manufacturer: Uniroyal; Manufacturer Part Number: WR25X000PTL; Supplier 1: LCSC; Supplier Part Number 1: C168600; JLCPCB Part Number: C168600; Power Rating: 1W; Category: Resistors; Package Size: 2512; JLCPCB Basic Part: Yes; Voltage Rating: 250V; Temperature Coefficient: ±200ppm/℃; Temperature Rating: -55℃~+155℃; ComponentLink1Description: Datasheet; ComponentLink1URL: https://wmsc.lcsc.com/wmsc/upload/file/pdf/v2/lcsc/2304140030_Walsin-Tech-Corp-WR25X000PTL_C168600.pdf; ComponentLink2Description: JLCPCB Part URL; ComponentLink2URL: https://jlcpcb.com/partdetail/C168600
pins: 1, 2
1 alternate drawing of the same symbol

## WR25X1R0JTL
designator R?  Resistance: 1Ω  (hidden comment: *)
Resistor, 1Ω, ±5%, 1W, 250V, ±200ppm/℃, -55℃~+155℃, SMD 2512; Manufacturer: Uniroyal; Manufacturer Part Number: WR25X1R0JTL; Supplier 1: LCSC; Supplier Part Number 1: C168603; JLCPCB Part Number: C168603; Power Rating: 1W; Category: Resistors; Package Size: 2512; JLCPCB Basic Part: Yes; Tolerance: ±5%; Voltage Rating: 250V; Temperature Coefficient: ±200ppm/℃; Temperature Rating: -55℃~+155℃; ComponentLink1Description: Datasheet; ComponentLink1URL: https://wmsc.lcsc.com/wmsc/upload/file/pdf/v2/lcsc/2304140030_Walsin-Tech-Corp-WR25X1R0JTL_C168603.pdf; ComponentLink2Description: JLCPCB Part URL; ComponentLink2URL: https://jlcpcb.com/partdetail/C168603
pins: 1, 2
1 alternate drawing of the same symbol

## WR25X1R6JTL
designator R?  Resistance: 1.6Ω  (hidden comment: *)
Resistor, 1.6Ω, ±5%, 1W, 250V, ±200ppm/℃, -55℃~+155℃, SMD 2512; Manufacturer: Uniroyal; Manufacturer Part Number: WR25X1R6JTL; Supplier 1: LCSC; Supplier Part Number 1: C470038; JLCPCB Part Number: C470038; Power Rating: 1W; Category: Resistors; Package Size: 2512; JLCPCB Basic Part: Yes; Tolerance: ±5%; Voltage Rating: 250V; Temperature Coefficient: ±200ppm/℃; Temperature Rating: -55℃~+155℃; ComponentLink1Description: Datasheet; ComponentLink1URL: https://wmsc.lcsc.com/wmsc/upload/file/pdf/v2/lcsc/2304140030_Walsin-Tech-Corp-WR25X1R6JTL_C470038.pdf; ComponentLink2Description: JLCPCB Part URL; ComponentLink2URL: https://jlcpcb.com/partdetail/C470038
pins: 1, 2
1 alternate drawing of the same symbol

## WR25X1R8JTL
designator R?  Resistance: 1.8Ω  (hidden comment: *)
Resistor, 1.8Ω, ±5%, 1W, 250V, ±200ppm/℃, -55℃~+155℃, SMD 2512; Manufacturer: Uniroyal; Manufacturer Part Number: WR25X1R8JTL; Supplier 1: LCSC; Supplier Part Number 1: C172289; JLCPCB Part Number: C172289; Power Rating: 1W; Category: Resistors; Package Size: 2512; JLCPCB Basic Part: Yes; Tolerance: ±5%; Voltage Rating: 250V; Temperature Coefficient: ±200ppm/℃; Temperature Rating: -55℃~+155℃; ComponentLink1Description: Datasheet; ComponentLink1URL: https://wmsc.lcsc.com/wmsc/upload/file/pdf/v2/lcsc/2304140030_Walsin-Tech-Corp-WR25X1R8JTL_C172289.pdf; ComponentLink2Description: JLCPCB Part URL; ComponentLink2URL: https://jlcpcb.com/partdetail/C172289
pins: 1, 2
1 alternate drawing of the same symbol

## WR25X2R0JTL
designator R?  Resistance: 2Ω  (hidden comment: *)
Resistor, 2Ω, ±5%, 1W, 250V, ±200ppm/℃, -55℃~+155℃, SMD 2512; Manufacturer: Uniroyal; Manufacturer Part Number: WR25X2R0JTL; Supplier 1: LCSC; Supplier Part Number 1: C171328; JLCPCB Part Number: C171328; Power Rating: 1W; Category: Resistors; Package Size: 2512; JLCPCB Basic Part: Yes; Tolerance: ±5%; Voltage Rating: 250V; Temperature Coefficient: ±200ppm/℃; Temperature Rating: -55℃~+155℃; ComponentLink1Description: Datasheet; ComponentLink1URL: https://wmsc.lcsc.com/wmsc/upload/file/pdf/v2/lcsc/2304140030_Walsin-Tech-Corp-WR25X2R0JTL_C171328.pdf; ComponentLink2Description: JLCPCB Part URL; ComponentLink2URL: https://jlcpcb.com/partdetail/C171328
pins: 1, 2
1 alternate drawing of the same symbol

## WR25X2R2JTL
designator R?  Resistance: 2.2Ω  (hidden comment: *)
Resistor, 2.2Ω, ±5%, 1W, 250V, ±200ppm/℃, -55℃~+155℃, SMD 2512; Manufacturer: Uniroyal; Manufacturer Part Number: WR25X2R2JTL; Supplier 1: LCSC; Supplier Part Number 1: C171329; JLCPCB Part Number: C171329; Power Rating: 1W; Category: Resistors; Package Size: 2512; JLCPCB Basic Part: Yes; Tolerance: ±5%; Voltage Rating: 250V; Temperature Coefficient: ±200ppm/℃; Temperature Rating: -55℃~+155℃; ComponentLink1Description: Datasheet; ComponentLink1URL: https://wmsc.lcsc.com/wmsc/upload/file/pdf/v2/lcsc/2304140030_Walsin-Tech-Corp-WR25X2R2JTL_C171329.pdf; ComponentLink2Description: JLCPCB Part URL; ComponentLink2URL: https://jlcpcb.com/partdetail/C171329
pins: 1, 2
1 alternate drawing of the same symbol

## WR25X2R4JTL
designator R?  Resistance: 2.4Ω  (hidden comment: *)
Resistor, 2.4Ω, ±5%, 1W, 250V, ±200ppm/℃, -55℃~+155℃, SMD 2512; Manufacturer: Uniroyal; Manufacturer Part Number: WR25X2R4JTL; Supplier 1: LCSC; Supplier Part Number 1: C172294; JLCPCB Part Number: C172294; Power Rating: 1W; Category: Resistors; Package Size: 2512; JLCPCB Basic Part: Yes; Tolerance: ±5%; Voltage Rating: 250V; Temperature Coefficient: ±200ppm/℃; Temperature Rating: -55℃~+155℃; ComponentLink1Description: Datasheet; ComponentLink1URL: https://wmsc.lcsc.com/wmsc/upload/file/pdf/v2/lcsc/2304140030_Walsin-Tech-Corp-WR25X2R4JTL_C172294.pdf; ComponentLink2Description: JLCPCB Part URL; ComponentLink2URL: https://jlcpcb.com/partdetail/C172294
pins: 1, 2
1 alternate drawing of the same symbol

## WR25X3R0JTL
designator R?  Resistance: 3Ω  (hidden comment: *)
Resistor, 3Ω, ±5%, 1W, 250V, ±200ppm/℃, -55℃~+155℃, SMD 2512; Manufacturer: Uniroyal; Manufacturer Part Number: WR25X3R0JTL; Supplier 1: LCSC; Supplier Part Number 1: C171337; JLCPCB Part Number: C171337; Power Rating: 1W; Category: Resistors; Package Size: 2512; JLCPCB Basic Part: Yes; Tolerance: ±5%; Voltage Rating: 250V; Temperature Coefficient: ±200ppm/℃; Temperature Rating: -55℃~+155℃; ComponentLink1Description: Datasheet; ComponentLink1URL: https://wmsc.lcsc.com/wmsc/upload/file/pdf/v2/lcsc/2304140030_Walsin-Tech-Corp-WR25X3R0JTL_C171337.pdf; ComponentLink2Description: JLCPCB Part URL; ComponentLink2URL: https://jlcpcb.com/partdetail/C171337
pins: 1, 2
1 alternate drawing of the same symbol
